# Altium footprint library Resistor.PcbLib: 88 footprints (part 4 of 6)
Each footprint in its own frame and in the unit in brackets; x right, y up, seen from the top. Pads: shape width x height; smd on the part's side, far side on the other; paste and mask are expansions set on the pad; w line width, h text height; cw(c..) or ccw(c..) is an arc to the next point about the centre after c.
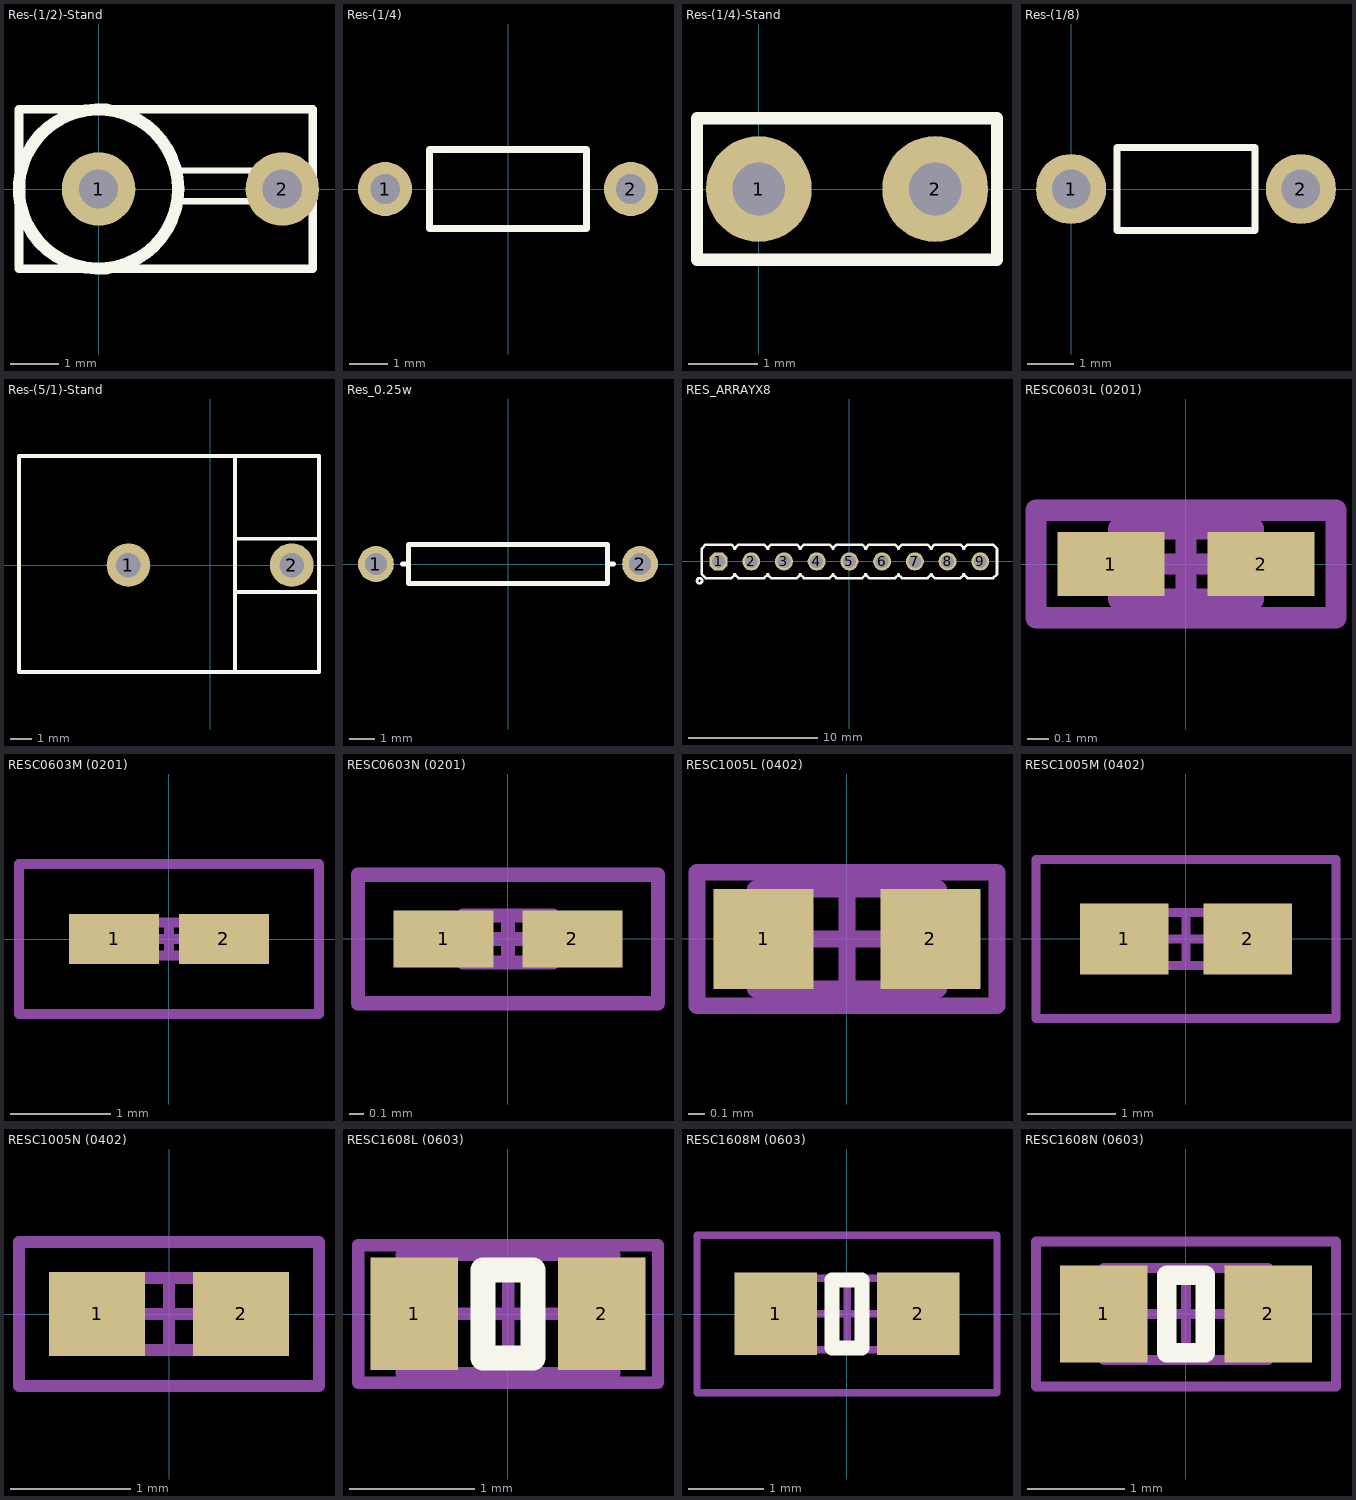
[diagram p3: the footprints below, top view; thin cyan lines are the x and y axes]

## Res-(1/2)-Stand [mil]
pads (2):
  round 60 hole 32: 1(0,0) 2(150,0)
Top Overlay:
  circle w10: c0,0 r65
  lines w5: 65,-10 125,-10 125,15 65,15
  lines w7: -65,-65 175,-65 175,65 -65,65 -65,-65
3D body: height 433, standoff 407, extent -13,-13 13,13
3D body: height 420, standoff -80, extent 137.01,-13 163.01,13
3D body: height 433, standoff 407, extent 0,-13 150,13
3D body: height 380, standoff 20, extent -65,-65 65,65
3D body: height 420, standoff -80, extent -13,-13 13,13
3D body: height 433, standoff 407, extent 137,-13 163,13
3D body: height 80, standoff 50, extent -66,-66 66,66
3D body: height 130, standoff 100, extent -66,-66 66,66
3D body: height 180, standoff 150, extent -66,-66 66,66
3D body: height 350, standoff 320, extent -66,-66 66,66

## Res-(1/4) [mil]
pads (2):
  round 55 hole 30: 1(-125,0) 2(125,0)
Top Overlay:
  lines w7.09: -80,-40 -80,40 80,40 80,-40 -80,-40
3D body "Res_Normal (0.25W).STEP": height 115.05, standoff -39.37, extent -135,-36.47 135,36

## Res-(1/4)-Stand [mil]
pads (2):
  round 60 hole 30: 1(0,0) 2(100,0)
Top Overlay:
  lines w7: -35,-40 -35,40 135,40 135,-40 -35,-40
3D body "Res 0.25W_Stand.STEP": height 287.32, standoff -57.17, extent -35.07,-35.47 111.08,37

## Res-(1/8) [mil]
pads (2):
  round 60 hole 33: 1(0,0) 2(196.85,0)
Top Overlay:
  lines w5.91: 39.37,-35.43 39.37,35.43 157.48,35.43 157.48,-35.43 39.37,-35.43
3D body "Res_18.STEP": height 76.63, standoff -32.9, extent -9.84,-31.64 206.69,29.3

## Res-(5/1)-Stand [mil]
pads (2):
  round 80 hole 45: 1(-150,0) 2(150,0)
Top Overlay:
  lines w7: 45.69,-196 45.69,200 ; 45.69,-49.37 200,-49.37 ; 45.69,48.31 200,48.31 ; -350.79,-196 -350.79,200 200,200 200,-196 -350.79,-196
3D body "5W Res.STEP": height 917.48, standoff -84.49, extent -345.48,-194 169.48,199.71

## Res_0.25w [mm]
pads (2):
  round 1.4 hole 0.85: 1(-5.155,0) 2(5.15,0)
Top Overlay:
  lines w0.2: -4.114,0 -3.885,0 ; 4.109,0 3.88,0 ; 3.88,0 3.88,-0.762 -3.885,-0.762 -3.885,0.762 3.88,0.762 3.88,0
3D body "Resistor_0.25W.STEP": height 2.93, standoff -2.54, extent -5.46,-1.156 5.31,1.156

## RES_ARRAYX8 [mm]
pads (9):
  oct 1.4x1.4 / inner oct 1.4x1.4 / far side oct 1.4x2.2 hole 1 mask+0.1: 1(-10.16,0)
  round 1.4 / inner round 1.4 / far side oval 1.4x2.2 hole 1 mask+0.1: 2(-7.62,0) 3(-5.08,0) 4(-2.54,0) 5(0,0) 6(2.54,0) 7(5.08,0) 8(7.62,0) 9(10.16,0)
Top Overlay:
  circle w0.2: c-11.63,-1.5 r0.2
  lines w0.2: -8.92,-1 -8.62,-1.3 -6.62,-1.3 -6.32,-1 ; -8.92,1 -8.62,1.3 -6.62,1.3 -6.32,1 ; -8.86,-1 -9.16,-1.3 -11.16,-1.3 -11.46,-1 -11.46,1 -11.16,1.3 -9.16,1.3 -8.86,1 ; -6.38,-1 -6.08,-1.3 -4.08,-1.3 -3.78,-1 ; -6.38,1 -6.08,1.3 -4.08,1.3 -3.78,1 ; -3.84,-1 -3.54,-1.3 -1.54,-1.3 -1.24,-1 ; -3.84,1 -3.54,1.3 -1.54,1.3 -1.24,1 ; -1.3,-1 -1,-1.3 1,-1.3 1.3,-1 ; -1.3,1 -1,1.3 1,1.3 1.3,1 ; 1.24,-1 1.54,-1.3 3.54,-1.3 3.84,-1 ; 1.24,1 1.54,1.3 3.54,1.3 3.84,1 ; 3.78,-1 4.08,-1.3 6.08,-1.3 6.38,-1 ; 3.78,1 4.08,1.3 6.08,1.3 6.38,1 ; 6.32,-1 6.62,-1.3 8.62,-1.3 8.92,-1 ; 6.32,1 6.62,1.3 8.62,1.3 8.92,1 ; 8.86,-1 9.16,-1.3 11.16,-1.3 11.46,-1 11.46,1 11.16,1.3 9.16,1.3 8.86,1
3D body "User Library-Resistor Pack 8.STEP": height 6.43, standoff -2, extent -11.405,-1.3 11.405,1.2

## RESC0603L (0201) [mm] "Chip Resistor, Body 0.6x0.3mm, IPC High Density"
height 0.3
pads (2):
  rect 0.5x0.3 smd: 1(-0.35,0) 2(0.35,0)
Mechanical 13:
  lines w0.1: -0.315,-0.165 0.315,-0.165 0.315,0.165 -0.315,0.165 -0.315,-0.165
Mechanical 15:
  lines w0.1: -0.165,0 0.165,0 ; 0,-0.165 0,0.165 ; -0.7,-0.25 0.7,-0.25 0.7,0.25 -0.7,0.25 -0.7,-0.25
3D body "RESC0603X28N.STEP": height 0.28, standoff 0, extent -0.3,-0.15 0.3,0.15

## RESC0603M (0201) [mm] "Chip Resistor, Body 0.6x0.3mm, IPC Low Density"
height 0.3
pads (2):
  rect 0.9x0.5 smd: 1(-0.55,0) 2(0.55,0)
Mechanical 13:
  lines w0.1: -0.315,-0.165 -0.315,0.165 0.315,0.165 0.315,-0.165 -0.315,-0.165
Mechanical 15:
  lines w0.1: -0.165,0 0.165,0 ; 0,-0.165 0,0.165 ; -1.5,-0.75 -1.5,0.75 1.5,0.75 1.5,-0.75 -1.5,-0.75
3D body "RESC0603X28N.STEP": height 0.28, standoff 0, extent -0.3,-0.15 0.3,0.15

## RESC0603N (0201) [mm] "Chip Resistor, Body 0.6x0.3mm, IPC Medium Density"
height 0.3
pads (2):
  rect 0.7x0.4 smd: 1(-0.45,0) 2(0.45,0)
Mechanical 13:
  lines w0.1: -0.315,-0.165 0.315,-0.165 0.315,0.165 -0.315,0.165 -0.315,-0.165
Mechanical 15:
  lines w0.1: -0.165,0 0.165,0 ; 0,-0.165 0,0.165 ; -1.05,-0.45 1.05,-0.45 1.05,0.45 -1.05,0.45 -1.05,-0.45
3D body "RESC0603X28N.STEP": height 0.28, standoff 0, extent -0.3,-0.15 0.3,0.15

## RESC1005L (0402) [mm] "Chip Resistor, Body 1.1x0.5mm, IPC High Density"
height 0.4
pads (2):
  rect 0.6x0.6 smd: 1(-0.5,0) 2(0.5,0)
Mechanical 13:
  lines w0.1: -0.55,-0.3 0.55,-0.3 0.55,0.3 -0.55,0.3 -0.55,-0.3
Mechanical 15:
  lines w0.1: -0.3,0 0.3,0 ; 0,-0.3 0,0.3 ; -0.9,-0.4 0.9,-0.4 0.9,0.4 -0.9,0.4 -0.9,-0.4
3D body "0402.STEP": height 0.35, standoff 0, extent -0.508,-0.254 0.508,0.254

## RESC1005M (0402) [mm] "Chip Resistor, Body 1.1x0.5mm, IPC Low Density"
height 0.4
pads (2):
  rect 1x0.8 smd: 1(-0.7,0) 2(0.7,0)
Mechanical 13:
  lines w0.1: -0.55,-0.3 -0.55,0.3 0.55,0.3 0.55,-0.3 -0.55,-0.3
Mechanical 15:
  lines w0.1: -0.3,0 0.3,0 ; 0,-0.3 0,0.3 ; -1.7,-0.9 -1.7,0.9 1.7,0.9 1.7,-0.9 -1.7,-0.9
3D body "0402.STEP": height 0.35, standoff 0, extent -0.508,-0.254 0.508,0.254

## RESC1005N (0402) [mm] "Chip Resistor, Body 1.1x0.5mm, IPC Medium Density"
height 0.4
pads (2):
  rect 0.8x0.7 smd: 1(-0.6,0) 2(0.6,0)
Mechanical 13:
  lines w0.1: -0.55,-0.3 -0.55,0.3 0.55,0.3 0.55,-0.3 -0.55,-0.3
Mechanical 15:
  lines w0.1: -0.3,0 0.3,0 ; 0,-0.3 0,0.3 ; -1.25,-0.6 -1.25,0.6 1.25,0.6 1.25,-0.6 -1.25,-0.6
3D body "0402.STEP": height 0.35, standoff 0, extent -0.508,-0.254 0.508,0.254

## RESC1608L (0603) [mm] "Chip Resistor, Body 1.6x0.8mm, IPC High Density"
height 0.6
pads (2):
  rect 0.7x0.9 smd: 1(-0.75,0) 2(0.75,0)
Top Overlay:
  lines w0.2: -0.2,-0.35 -0.2,0.35 0.2,0.35 0.2,-0.35 -0.2,-0.35
Mechanical 13:
  lines w0.1: -0.85,-0.475 -0.85,0.475 0.85,0.475 0.85,-0.475 -0.85,-0.475
Mechanical 15:
  lines w0.1: -0.475,0 0.475,0 ; 0,-0.475 0,0.475 ; -1.2,-0.55 -1.2,0.55 1.2,0.55 1.2,-0.55 -1.2,-0.55
3D body "0603.STEP": height 0.45, standoff 0, extent -0.762,-0.381 0.762,0.381

## RESC1608M (0603) [mm] "Chip Resistor, Body 1.6x0.8mm, IPC Low Density"
height 0.6
pads (2):
  rect 1.1x1.1 smd: 1(-0.95,0) 2(0.95,0)
Top Overlay:
  lines w0.2: -0.2,-0.45 -0.2,0.45 0.2,0.45 0.2,-0.45 -0.2,-0.45
Mechanical 13:
  lines w0.1: -0.85,-0.475 -0.85,0.475 0.85,0.475 0.85,-0.475 -0.85,-0.475
Mechanical 15:
  lines w0.1: -0.475,0 0.475,0 ; 0,-0.475 0,0.475 ; -2,-1.05 -2,1.05 2,1.05 2,-1.05 -2,-1.05
3D body "0603.STEP": height 0.45, standoff 0, extent -0.762,-0.381 0.762,0.381

## RESC1608N (0603) [mm] "Chip Resistor, Body 1.6x0.8mm, IPC Medium Density"
height 0.6
pads (2):
  rect 0.9x1 smd: 1(-0.85,0) 2(0.85,0)
Top Overlay:
  lines w0.2: -0.2,-0.4 0.2,-0.4 0.2,0.4 -0.2,0.4 -0.2,-0.4
Mechanical 13:
  lines w0.1: -0.85,-0.475 0.85,-0.475 0.85,0.475 -0.85,0.475 -0.85,-0.475
Mechanical 15:
  lines w0.1: -0.475,0 0.475,0 ; 0,-0.475 0,0.475 ; -1.55,-0.75 1.55,-0.75 1.55,0.75 -1.55,0.75 -1.55,-0.75
3D body "0603.STEP": height 0.45, standoff 0, extent -0.762,-0.381 0.762,0.381